# Altium footprint library capacitors.PcbLib: 59 footprints (part 2 of 4)
Each footprint in its own frame and in the unit in brackets; x right, y up, seen from the top. Pads: shape width x height; smd on the part's side, far side on the other; paste and mask are expansions set on the pad; w line width, h text height; cw(c..) or ccw(c..) is an arc to the next point about the centre after c.
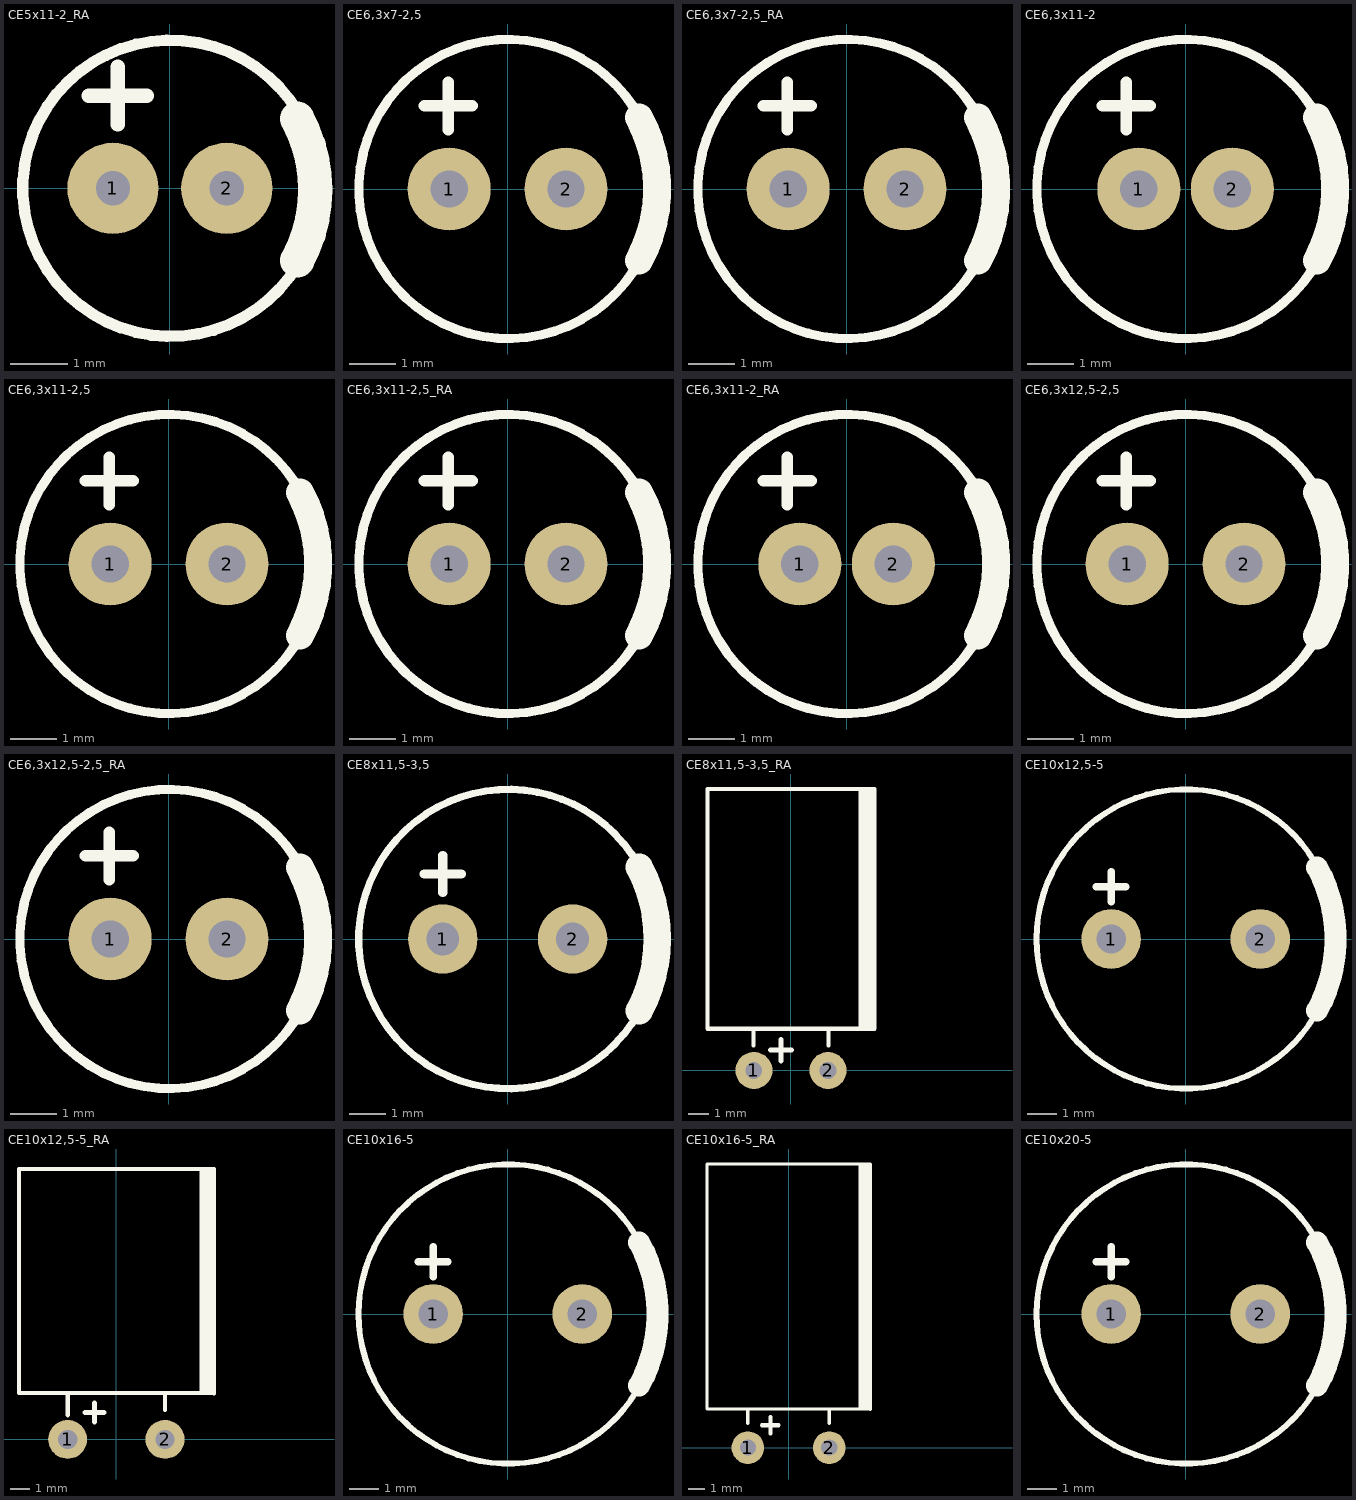
[diagram p1: the footprints below, top view; thin cyan lines are the x and y axes]

## CE5x11-2_RA [mm] "Aluminium Electrolytic Capacitor -  Radius: 5mm, Height: 11mm, PinSpacing: 2mm, Right Angle"
height 5.5
pads (2):
  round 1.6 hole 0.6: 1(-1,0) 2(1,0)
Top Overlay:
  circle w0.2: c0.018,0 r2.6
  lines w0.25: -1.422,1.626 -0.406,1.626 ; -0.914,1.118 -0.914,2.134
  lines w0.6: 2.235,-1.27 ccw(c-0.047,-0.025) 2.235,1.22
3D body "User Library-Cap electro 5x11x2mm RA.STEP": height 5.03, standoff -1.5, extent -2.525,-0.3 2.525,13.021

## CE6,3x7-2,5 [mm] "Aluminium Electrolytic Capacitor -  Radius: 6,3mm, Height: 7mm, PinSpacing: 2,5mm"
height 7
pads (2):
  round 1.778 hole 0.8: 1(-1.25,0) 2(1.25,0)
Top Overlay:
  circle w0.2: c0.018,0 r3.2
  lines w0.25: -1.778,1.778 -0.762,1.778 ; -1.27,1.27 -1.27,2.286
  lines w0.6: 2.809,-1.532 ccw(c0,0) 2.809,1.532
3D body "User Library-Cap electro 6_3x7x2_5mm.STEP": height 7.28, standoff -2.25, extent -3.15,-3.175 3.201,3.175

## CE6,3x7-2,5_RA [mm] "Aluminium Electrolytic Capacitor -  Radius: 6,3mm, Height: 7mm, PinSpacing: 2,5mm, Right Angle"
height 3.5
pads (2):
  round 1.778 hole 0.8: 1(-1.25,0) 2(1.25,0)
Top Overlay:
  circle w0.2: c0.018,0 r3.2
  lines w0.25: -1.778,1.778 -0.762,1.778 ; -1.27,1.27 -1.27,2.286
  lines w0.6: 2.809,-1.532 ccw(c0,0) 2.809,1.532
3D body "User Library-Cap electro 6_3x7x2_5mm RA.STEP": height 6.33, standoff -1.85, extent -3.175,-0.32 3.176,9.001

## CE6,3x11-2 [mm] "Aluminium Electrolytic Capacitor -  Radius: 6,3mm, Height: 11mm, PinSpacing: 2mm"
height 11
pads (2):
  round 1.778 hole 0.8: 1(-1,0) 2(1,0)
Top Overlay:
  circle w0.2: c0.018,0 r3.2
  lines w0.25: -1.778,1.778 -0.762,1.778 ; -1.27,1.27 -1.27,2.286
  lines w0.6: 2.809,-1.532 ccw(c0,0) 2.809,1.532
3D body "User Library-Cap electro 6_3x11x2mm.STEP": height 11.28, standoff -2.25, extent -3.15,-3.175 3.201,3.175

## CE6,3x11-2,5 [mm] "Aluminium Electrolytic Capacitor -  Radius: 6,3mm, Height: 11mm, PinSpacing: 2,5mm"
height 11
pads (2):
  round 1.778 hole 0.8: 1(-1.25,0) 2(1.25,0)
Top Overlay:
  circle w0.2: c0.018,0 r3.2
  lines w0.25: -1.778,1.778 -0.762,1.778 ; -1.27,1.27 -1.27,2.286
  lines w0.6: 2.809,-1.532 ccw(c0,0) 2.809,1.532
3D body "User Library-Cap electro 6_3x11x2_5mm.STEP": height 11.28, standoff -2.25, extent -3.15,-3.175 3.201,3.175

## CE6,3x11-2,5_RA [mm] "Aluminium Electrolytic Capacitor -  Radius: 6,3mm, Height: 11mm, PinSpacing: 2,5mm, Right Angle"
height 5.5
pads (2):
  round 1.778 hole 0.8: 1(-1.25,0) 2(1.25,0)
Top Overlay:
  circle w0.2: c0.018,0 r3.2
  lines w0.25: -1.778,1.778 -0.762,1.778 ; -1.27,1.27 -1.27,2.286
  lines w0.6: 2.809,-1.532 ccw(c0,0) 2.809,1.532
3D body "User Library-Cap electro 6_3x11x2_5mm RA.STEP": height 6.33, standoff -1.85, extent -3.175,-0.345 3.176,12.976

## CE6,3x11-2_RA [mm] "Aluminium Electrolytic Capacitor -  Radius: 6,3mm, Height: 11mm, PinSpacing: 2mm, Right Angle"
height 5.5
pads (2):
  round 1.778 hole 0.8: 1(-1,0) 2(1,0)
Top Overlay:
  circle w0.2: c0.018,0 r3.2
  lines w0.25: -1.778,1.778 -0.762,1.778 ; -1.27,1.27 -1.27,2.286
  lines w0.6: 2.809,-1.532 ccw(c0,0) 2.809,1.532
3D body "User Library-Cap electro 6_3x11x2mm RA.STEP": height 6.33, standoff -1.85, extent -3.175,-0.37 3.176,12.951

## CE6,3x12,5-2,5 [mm] "Aluminium Electrolytic Capacitor -  Radius: 6,3mm, Height: 12,5mm, PinSpacing: 2,5mm"
height 12.5
pads (2):
  round 1.778 hole 0.8: 1(-1.25,0) 2(1.25,0)
Top Overlay:
  circle w0.2: c0.018,0 r3.2
  lines w0.25: -1.778,1.778 -0.762,1.778 ; -1.27,1.27 -1.27,2.286
  lines w0.6: 2.809,-1.532 ccw(c0,0) 2.809,1.532
3D body "User Library-Cap electro 6_3x12_5x2_5mm.STEP": height 12.78, standoff -2.25, extent -3.15,-3.175 3.201,3.175

## CE6,3x12,5-2,5_RA [mm] "Aluminium Electrolytic Capacitor -  Radius: 6,3mm, Height: 12,5mm, PinSpacing: 2,5mm, Right Angle"
height 6.25
pads (2):
  round 1.778 hole 0.8: 1(-1.25,0) 2(1.25,0)
Top Overlay:
  circle w0.2: c0.018,0 r3.2
  lines w0.25: -1.778,1.778 -0.762,1.778 ; -1.27,1.27 -1.27,2.286
  lines w0.6: 2.809,-1.532 ccw(c0,0) 2.809,1.532
3D body "User Library-Cap electro 6_3x12_5x2_5mm RA.STEP": height 6.33, standoff -1.85, extent -3.175,-0.345 3.176,14.476

## CE8x11,5-3,5 [mm] "Aluminium Electrolytic Capacitor -  Radius: 8mm, Height: 11,5mm, PinSpacing: 3,5mm"
height 11.5
pads (2):
  round 1.9 hole 0.9: 1(-1.778,0) 2(1.778,0)
Top Overlay:
  circle w0.2: c0.018,0 r4.1
  lines w0.25: -2.286,1.778 -1.27,1.778 ; -1.778,1.27 -1.778,2.286
  lines w0.75: 3.599,-1.963 ccw(c0,0) 3.599,1.963
3D body "User Library-Cap electro 8x11_5x3_5mm.STEP": height 11.78, standoff -2.25, extent -4,-4.025 4.051,4.025

## CE8x11,5-3,5_RA [mil] "Aluminium Electrolytic Capacitor -  Radius: 8mm, Height: 11,5mm, PinSpacing: 3,5mm, Right Angle"
height 226.38
pads (2):
  round 70 hole 31.5: 1(-70,0) 2(70,0)
Top Overlay:
  region: 157.48,78.74 157.48,531.5 127.95,531.5 127.95,78.74
  lines w7.87: -70.87,47.24 -70.87,78.74 ; 70.87,47.24 70.87,78.74 ; -157.48,78.74 157.48,78.74 157.48,531.5 -157.48,531.5 -157.48,78.74
  lines w9.84: -38.82,38.5 1.18,38.5 ; -18.82,18.5 -18.82,58.5
3D body "User Library-Cap electro 8x11_5x3_5mm RA.STEP": height 319.9, standoff -74.8, extent -160.44,-11.8 156.52,532.33

## CE10x12,5-5 [mil] "Aluminium Electrolytic Capacitor -  Radius: 10mm, Height: 12,5mm, PinSpacing: 5mm"
height 492.13
pads (2):
  round 80 hole 39.37: 1(-100,0) 2(100,0)
Top Overlay:
  circle w7.87: c0.72,0 r200.79
  lines w9.84: -120,70 -80,70 ; -100,50 -100,90
  lines w29.53: 176.27,-96.15 ccw(c0,0) 176.27,96.15
3D body "User Library-Cap electro 10x12_5x5_0mm.STEP": height 502.97, standoff -88.58, extent -198.85,-197.85 196.85,197.85

## CE10x12,5-5_RA [mil] "Aluminium Electrolytic Capacitor -  Radius: 10mm, Height: 12,5mm, PinSpacing: 5mm, Right Angle"
height 246.06
pads (2):
  round 80 hole 39.37: 1(-100,0) 2(100,0)
Top Overlay:
  region: 200.79,94.49 200.79,555.12 171.26,555.12 171.26,94.49
  lines w7.87: 100,60 100,95 ; 200,95 -200,95 -200,555.12 200.79,555.12 200.79,94.49
  lines w9.84: -100,50 -100,90 ; -64.88,55.2 -24.88,55.2 ; -44.88,35.2 -44.88,75.2
3D body "User Library-Cap electro 10x12_5x5_0mm RA.STEP": height 394.7, standoff -66.93, extent -197.85,-15.75 197.85,555.07

## CE10x16-5 [mil] "Aluminium Electrolytic Capacitor -  Radius: 10mm, Height: 16mm, PinSpacing: 5mm"
height 629.92
pads (2):
  round 80 hole 39.37: 1(-100,0) 2(100,0)
Top Overlay:
  circle w7.87: c0.72,0 r200.79
  lines w9.84: -120,70 -80,70 ; -100,50 -100,90
  lines w29.53: 176.27,-96.15 ccw(c0,0) 176.27,96.15
3D body "User Library-Cap electro 10x16x5_0mm.STEP": height 640.76, standoff -88.58, extent -198.85,-197.85 196.85,197.85

## CE10x16-5_RA [mil] "Aluminium Electrolytic Capacitor -  Radius: 10mm, Height: 16mm, PinSpacing: 5mm, Right Angle"
height 314.96
pads (2):
  round 80 hole 39.37: 1(-100,0) 2(100,0)
Top Overlay:
  region: 200.79,94.49 200.79,696.85 171.26,696.85 171.26,94.49
  lines w7.87: -100,60 -100,95 ; 100,60 100,95 ; 200,95 -200,95 -200,697 200,697 ; 200.79,94.49 200.79,696.85
  lines w9.84: -64.88,55.2 -24.88,55.2 ; -44.88,35.2 -44.88,75.2
3D body "User Library-Cap electro 10x16x5_0mm RA.STEP": height 394.7, standoff -66.3, extent -197.85,-14.76 197.85,693.45

## CE10x20-5 [mil] "Aluminium Electrolytic Capacitor -  Radius: 10mm, Height: 20mm, PinSpacing: 5mm"
height 787.4
pads (2):
  round 80 hole 39.37: 1(-100,0) 2(100,0)
Top Overlay:
  circle w7.87: c0.72,0 r200.79
  lines w9.84: -120,70 -80,70 ; -100,50 -100,90
  lines w29.53: 176.27,-96.15 ccw(c0,0) 176.27,96.15
3D body "User Library-Cap electro 10x20x5_0mm.STEP": height 798.24, standoff -88.58, extent -198.85,-197.85 196.85,197.85